# Altium footprint library 集大电协1.2.PcbLib: 197 footprints (part 5 of 13)
Each footprint in its own frame and in the unit in brackets; x right, y up, seen from the top. Pads: shape width x height; smd on the part's side, far side on the other; paste and mask are expansions set on the pad; w line width, h text height; cw(c..) or ccw(c..) is an arc to the next point about the centre after c.
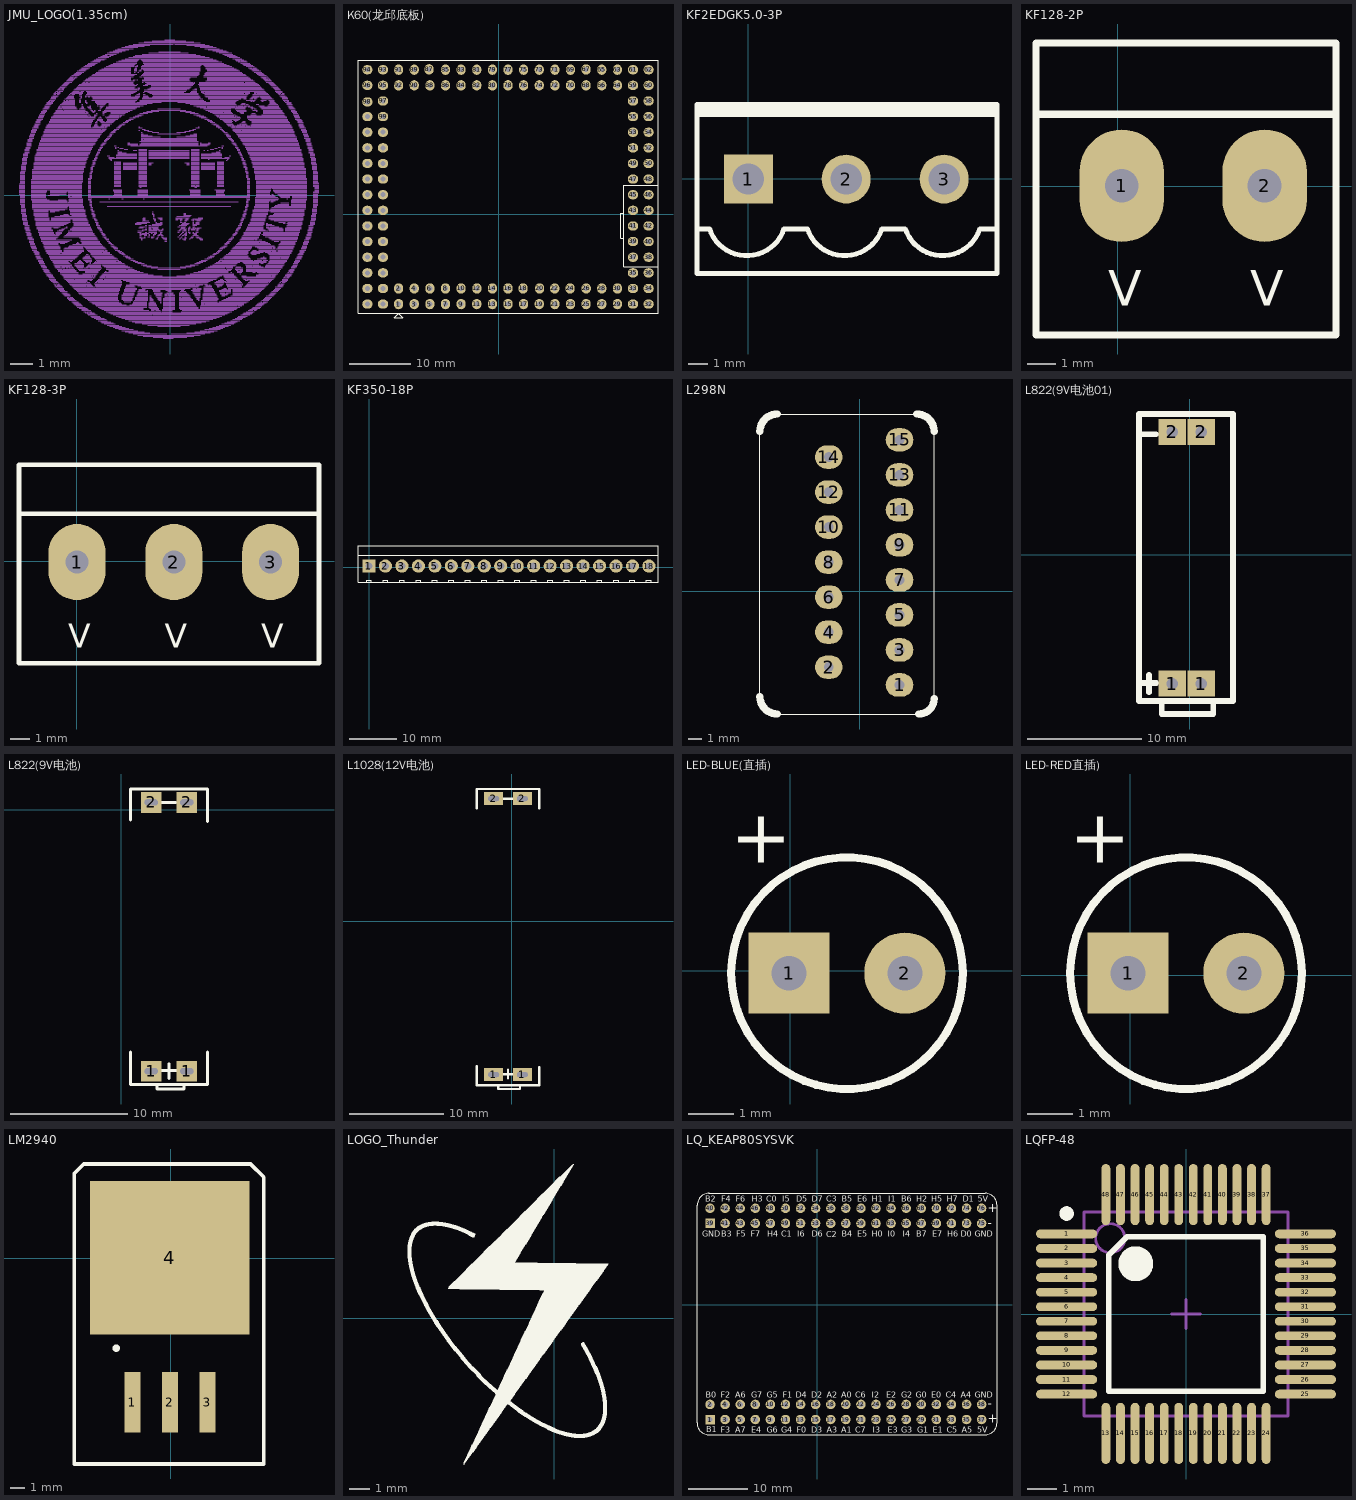
[diagram p4: the footprints below, top view; thin cyan lines are the x and y axes]

## JMU_LOGO(1.35cm) [mm]
Bottom Overlay:
  drawing of 2455 lines, arcs and shapes, not listed
  text "1918" at -0.759,-2.891 h1.27

## K60(龙邱底板) [mil]
pads (124):
  oval 59x66 hole 32: 1(-640,-575.68) 2(-640,-475.68) 3(-540,-575.68) 4(-540,-475.68) 5(-440,-575.68) 6(-440,-475.68) 7(-340,-575.68) 8(-340,-475.68) 9(-240,-575.68) 10(-240,-475.68) 11(-140,-575.68) 12(-139.21,-475.68) 13(-40,-575.68) 14(-40,-475.68) 15(60,-575.68) 16(60,-475.68) 17(160,-575.68) 18(156.85,-475.68) 19(260,-575.68) 20(262.36,-475.68) 21(360,-575.68) 22(358.82,-475.68) 23(460,-575.68) 24(457.64,-475.68) 25(560,-575.68) 26(560.39,-475.68) 27(660,-575.68) 28(660,-475.68) 29(760,-575.68) 30(760.39,-475.68) 63(760,924.32) 64(760,824.32) 65(660,924.32) 66(660,824.32) 67(560,926.29) 68(560,824.32) 69(460,924.32) 70(460,824.32) 71(360,924.32) 72(360,824.32) 73(260,924.32) 74(260,824.32) 75(160,924.32) 76(160,824.32) 77(60,924.32) 78(60,824.32) 79(-40,924.32) 80(-40,824.32) 81(-140,924.32) 82(-140,824.32) 83(-240,924.32) 84(-240,824.32) 85(-340,924.32) 86(-340,824.32) 87(-445.12,926.68) 88(-440,824.32) 89(-540,924.32) 90(-540,824.32) 91(-640,924.32) 92(-640,824.32)
  oval 66x59 hole 32: 31(860,-575.68) 32(960,-575.68) 33(860,-475.68) 34(960,-475.68) 35(860,-375.68) 36(960,-375.68) 37(860,-275.68) 38(960,-275.68) 39(860,-174.89) 40(960,-175.68) 41(860,-75.68) 42(960,-75.29) 43(860,24.32) 44(960,24.32) 45(860,124.32) 46(960,124.32) 47(860,224.32) 48(960,224.32) 49(860,324.32) 50(960,324.32) 51(860,424.32) 52(960,424.32) 53(860,524.32) 54(960,524.32) 55(860,624.32) 56(960,624.32) 57(860,724.32) 58(960,724.32) 59(860,824.32) 60(960,824.32) 61(860,924.32) 62(960,924.32) 93(-740,924.32) 94(-840,924.32) 95(-740,824.32) 96(-840,824.32) 97(-740,724.32) 98(-840,718.41) 99(-740,624.32) 100(-840,624.32) 101(-740,524.32) 102(-840,524.32) 103(-740,424.32) 104(-840,424.32) 105(-740,323.92) 106(-840,324.71) 107(-740,224.32) 108(-840,224.32) 109(-740,124.32) 110(-840,124.32) 111(-740,24.32) 112(-840,24.32) 113(-740,-75.68) 114(-840,-75.68) 115(-740,-175.68) 116(-840,-175.68) 117(-740,-275.68) 118(-840,-275.68) 119(-740,-375.68) 120(-840,-375.68) 121(-740,-475.68) 122(-840,-475.68) 123(-740,-575.68) 124(-840,-575.68)
Top Overlay:
  lines w5.91: 800,-155.68 780,-155.68 780,4.32 800,4.32 ; 1020,-335.68 800,-335.68 800,184.32 1020,184.32
  lines w7.87: -641.18,-634.74 -614.02,-662.3 -668.35,-662.3 -640.79,-634.74 ; -900,-635.68 1020,-635.68 1020,984.32 -900,984.32 -900,-635.68

## KF2EDGK5.0-3P [mm]
pads (3):
  rect 2.5x2.5 hole 1.6: 1(0,-0.025)
  round 2.5 hole 1.6: 2(5,-0.025) 3(10,-0.025)
Top Overlay:
  lines w0.254: -2.62,-2.565 -1.985,-2.565 ccw(c-0.08,-1.93) 1.825,-2.565 3.015,-2.565 ccw(c4.92,-1.93) 6.825,-2.565 8.015,-2.565 ccw(c9.92,-1.93) 11.825,-2.565 12.667,-2.565 ; -2.62,3.277 12.7,3.277 ; -2.62,3.531 12.7,3.531 ; -2.62,-4.851 -2.62,3.785 12.7,3.785 12.7,-4.851 -2.62,-4.851
3D body "KF2EDGK5.0-LI.STEP": height 11.25, standoff -2.95, extent 2.46,-4.783 7.54,3.717
3D body "KF2EDGK5.0-LI.STEP": height 11.25, standoff -2.95, extent -2.54,-4.783 2.54,3.717
3D body "KF2EDGK5.0-LI.STEP": height 11.25, standoff -2.95, extent 7.46,-4.783 12.54,3.717

## KF128-2P [mm]
pads (2):
  oval 3x4 hole 1.2: 1(0.134,0.024) 2(5.214,0.024)
Top Overlay:
  lines w0.254: -2.914,2.564 7.754,2.564 ; -2.914,-5.285 7.754,-5.285 7.754,5.1 -2.914,5.1 -2.914,-5.285
  text "V" at -0.347,-4.245 h1.27
  text "V" at 4.706,-4.245 h1.27
3D body "KF128-5.08-.STEP": height 14.15, standoff -3.95, extent 2.166,-5.353 7.746,5.147
3D body "KF128-5.08-.STEP": height 14.15, standoff -3.95, extent -2.914,-5.353 2.666,5.147

## KF128-3P [mm]
pads (3):
  oval 3x4 hole 1.2: 1(0.025,-0.05) 2(5.105,-0.05) 3(10.185,-0.05)
Top Overlay:
  lines w0.254: -3.023,2.49 12.725,2.49 ; -3.023,-5.359 12.725,-5.359 12.725,5.055 -3.023,5.055 -3.023,-5.359
  text "V" at 9.681,-4.545 h1.27
  text "V" at 4.628,-4.545 h1.27
  text "V" at -0.425,-4.545 h1.27
3D body "KF128-5.08-.STEP": height 14.15, standoff -3.95, extent 7.144,-5.434 12.724,5.066
3D body "KF128-5.08-.STEP": height 14.15, standoff -3.95, extent 2.064,-5.434 7.644,5.066
3D body "KF128-5.08-.STEP": height 14.15, standoff -3.95, extent -3.016,-5.434 2.564,5.066

## KF350-18P [mil]
pads (18):
  rect 110x110 hole 59.06: 1(-1.14,8.5)
  round 110 hole 59.06: 2(136.65,8.5) 3(274.45,8.51) 4(412.25,8.51) 5(550.04,8.51) 6(687.84,8.51) 7(825.63,8.5) 8(963.43,8.5) 9(1101.22,8.5) 10(1239.02,8.5) 11(1376.81,8.5) 12(1514.61,8.5) 13(1652.4,8.5) 14(1790.2,8.5) 15(1927.99,8.5) 16(2065.99,8.5) 17(2203.74,8.5) 18(2341.54,8.5)
Top Overlay:
  lines w10: -93.14,100.5 1039.86,100.5 1176.14,100.5 ; -21.14,-128.5 -21.14,-111.5 18.86,-111.5 18.86,-128.5 ; 116.65,-128.5 116.65,-111.5 156.65,-111.5 156.65,-128.5 ; 254.45,-128.49 254.45,-111.5 294.45,-111.5 294.45,-128.49 ; 392.25,-128.49 392.25,-111.5 432.25,-111.5 432.25,-128.49 ; 530.04,-128.49 530.04,-111.5 570.04,-111.5 570.04,-128.49 ; 667.86,-128.5 667.86,-111.5 707.86,-111.5 707.86,-128.5 ; 805.86,-128.5 805.86,-111.5 845.86,-111.5 845.86,-128.5 ; 943.86,-128.5 943.86,-111.5 983.86,-111.5 983.86,-128.5 ; 1081.65,-128.5 1081.65,-111.5 1121.65,-111.5 1121.65,-128.5 ; 1177.65,100.5 1313.94,100.5 ; 1219.45,-128.5 1219.45,-111.5 1259.45,-111.5 1259.45,-128.5 ; 1315.45,100.5 1451.73,100.5 ; 1357.25,-128.5 1357.25,-111.5 1397.25,-111.5 1397.25,-128.5 ; 1453.25,100.5 1589.53,100.5 ; 1495.04,-128.5 1495.04,-111.5 1535.04,-111.5 1535.04,-128.5 ; 1591.04,100.5 1727.32,100.5 ; 1632.84,-128.5 1632.84,-111.5 1672.84,-111.5 1672.84,-128.5 ; 1728.84,100.5 1865.12,100.5 ; 1770.63,-128.5 1770.63,-111.5 1810.63,-111.5 1810.63,-128.5 ; 1866.63,100.5 2002.91,100.5 ; 1908.43,-128.5 1908.43,-111.5 1948.43,-111.5 1948.43,-128.5 ; 1996.63,100.5 2416.34,100.39 ; 2046.43,-128.5 2046.43,-111.5 ; 2047.43,-111.5 2087.43,-111.5 2087.43,-128.5 ; 2181.27,-126.53 2181.27,-109.53 ; 2182.27,-109.53 2222.27,-109.53 2222.27,-126.53 ; 2319.06,-127.51 2319.06,-110.51 ; 2320.06,-110.51 2360.06,-110.51 2360.06,-127.51 ; -93.14,-128.5 -93.14,180.5 1039.86,180.5 1177.65,180.5 1315.45,180.5 1453.25,180.5 1591.04,180.5 1728.84,180.5 1866.63,180.5 2417.32,180.5 2417.32,-128.5 1866.63,-128.5 1728.84,-128.5 1591.04,-128.5 1453.25,-128.5 1315.45,-128.5 1177.65,-128.5 1039.86,-128.5 -93.14,-128.5

## L298N [mm]
pads (15):
  oval 2x1.7 hole 0.712: 1(2.87,-6.807) 2(-2.261,-5.512) 3(2.87,-4.267) 4(-2.261,-2.972) 5(2.87,-1.727) 6(-2.261,-0.432) 7(2.87,0.813) 8(-2.261,2.108) 9(2.87,3.353) 10(-2.261,4.648) 11(2.87,5.893) 12(-2.261,7.188) 13(2.87,8.433) 14(-2.261,9.728) 15(2.87,10.973)
Top Overlay:
  lines w0.076: -7.264,-7.645 -7.264,11.582 ; -5.994,-8.915 4.267,-8.915 ; -5.994,12.852 4.115,12.852 ; 5.385,-7.925 5.385,11.582
  lines w0.54: -7.264,-7.645 ccw(c-5.994,-7.645) -5.994,-8.915 ; -7.264,11.582 cw(c-5.994,11.582) -5.994,12.852 ; 4.115,12.852 cw(c4.115,11.582) 5.385,11.582 ; 4.267,-8.915 ccw(c4.267,-7.798) 5.385,-7.798
3D body "User Library-Multiwatt15V.STEP": height 21.3, standoff -1, extent -6.883,-7.666 3.007,11.934

## L822(9V电池01) [mil]
pads (4):
  rect 95x90 hole 40: 1(-60,-445) 1(40,-445) 2(-60,423) 2(40,423)
Top Overlay:
  lines w20: -165,-442.72 -115,-442.72 ; -165,415 -115.94,415 ; -140.63,-475 -140.63,-415 ; -95.94,-510.51 -95.94,-549.88 81.22,-549.88 81.22,-510.51 ; -175,-505 -175,-145.55 -175,485 150,485 150,-505 -175,-505

## L822(9V电池) [mil]
pads (4):
  rect 70x70 hole 20 slot 45 at 0 deg: 1(100,-880) 1(220,-880) 2(100,25) 2(220,25)
Top Overlay:
  lines w10: 30,-815 30,-925 290,-925 290,-815 ; 30,-35 30,70 290,70 290,-40 ; 120,-930 120,-940 210,-940 210,-930 ; 135,25 184.06,25 ; 135.63,-877.72 185.63,-877.72 ; 160,-905 160,-855

## L1028(12V电池) [mil]
pads (4):
  rect 80x55 hole 20 slot 45 at 0 deg: 1(-75,-640) 1(45,-640) 2(-75,510) 2(45,510)
Top Overlay:
  lines w10: -145,-605 -145,-685 115,-685 115,-610 ; -145,470 -145,550 115,550 115,470 ; -55,-690 -55,-700 35,-700 35,-690 ; -40,510 9.06,510 ; -39.37,-637.72 10.63,-637.72 ; -15,-655 -15,-620

## LED-BLUE(直插) [mil]
pads (2):
  rect 70x70 hole 30: 1(-0.98,-1.97)
  round 70 hole 30: 2(99.02,-1.97)
Top Overlay:
  circle w7: c49.02,-1.97 r100
  text "+" at 1.39,78.32 h78.74
3D body: height 204.72, standoff -78.74, extent -21.65,-79.72 116.93,77.76

## LED-RED直插) [mil]
pads (2):
  rect 70x70 hole 30: 1(-1.97,1.97)
  round 70 hole 30: 2(98.03,1.97)
Top Overlay:
  circle w7: c48.03,1.97 r100
  text "+" at 0.41,82.26 h78.74
3D body: height 204.72, standoff -78.74, extent -19.68,-76.76 118.9,80.71

## LM2940 [mm]
pads (4):
  rect 1.1x4.1 smd: 1(-2.591,-9.732) 2(-0.051,-9.732) 3(2.489,-9.732)
  rect 10.8x10.41 smd: 4(-0.051,0.047)
Top Overlay:
  circle w0.25: c-3.691,-6.076 r0.125
  lines w0.254: -6.528,-13.923 -6.528,5.762 -5.893,6.397 5.41,6.397 6.299,5.508 6.299,-13.923 -6.528,-13.923
3D body: height 5, standoff 0, extent -6.2,-5.2 6,6.2

## LOGO_Thunder [mm]
Top Overlay:
  drawing of 2284 lines, arcs and shapes, not listed

## LQ_KEAP80SYSVK [mm]
pads (76):
  rect 1.6x1.6 hole 0.9: 1(-18.016,-19.342) 39(-18.016,13.678)
  round 1.6 hole 0.9: 2(-18.016,-16.802) 3(-15.476,-19.342) 4(-15.476,-16.802) 5(-12.936,-19.342) 6(-12.936,-16.802) 7(-10.396,-19.342) 8(-10.396,-16.802) 9(-7.856,-19.342) 10(-7.856,-16.802) 11(-5.316,-19.342) 12(-5.316,-16.802) 13(-2.776,-19.342) 14(-2.776,-16.802) 15(-0.236,-19.342) 16(-0.236,-16.802) 17(2.304,-19.342) 18(2.304,-16.802) 19(4.844,-19.342) 20(4.844,-16.802) 21(7.384,-19.342) 22(7.384,-16.802) 23(9.924,-19.342) 24(9.924,-16.802) 25(12.464,-19.342) 26(12.464,-16.802) 27(15.004,-19.342) 28(15.004,-16.802) 29(17.544,-19.342) 30(17.544,-16.802) 31(20.084,-19.342) 32(20.084,-16.802) 33(22.624,-19.342) 34(22.624,-16.802) 35(25.164,-19.342) 36(25.164,-16.802) 37(27.704,-19.342) 38(27.704,-16.802) 40(-18.016,16.218) 41(-15.476,13.678) 42(-15.476,16.218) 43(-12.936,13.678) 44(-12.936,16.218) 45(-10.396,13.678) 46(-10.396,16.218) 47(-7.856,13.678) 48(-7.856,16.218) 49(-5.316,13.678) 50(-5.316,16.218) 51(-2.776,13.678) 52(-2.776,16.218) 53(-0.236,13.678) 54(-0.236,16.218) 55(2.304,13.678) 56(2.304,16.218) 57(4.844,13.678) 58(4.844,16.218) 59(7.384,13.678) 60(7.384,16.218) 61(9.924,13.678) 62(9.924,16.218) 63(12.464,13.678) 64(12.464,16.218) 65(15.004,13.678) 66(15.004,16.218) 67(17.544,13.678) 68(17.544,16.218) 69(20.084,13.678) 70(20.084,16.218) 71(22.624,13.678) 72(22.624,16.218) 73(25.164,13.678) 74(25.164,16.218) 75(27.704,13.678) 76(27.704,16.218)
Top Overlay:
  lines w0.2: -20.208,16.739 -20.208,-19.905 ccw(c-18.208,-19.905) -18.208,-21.905 28.292,-21.905 ccw(c28.292,-19.905) 30.292,-19.905 30.292,16.739 ccw(c28.292,16.739) 28.292,18.739 -18.208,18.739 ; -20.158,16.749 cw(c-18.158,16.749) -18.158,18.749
  text "-" at 28.752,13.039 h1.5
  text "+" at 28.742,-19.901 h1.5
  text "-" at 28.752,-17.401 h1.5
  text "+" at 28.762,15.579 h1.5
  text "C3" at 1.522,17.289 h1
  text "H2" at 16.702,17.289 h1
  text "5V" at 26.992,-21.561 h1
  text "A5" at 24.322,-21.561 h1
  text "C5" at 21.822,-21.561 h1
  text "E1" at 19.482,-21.551 h1
  text "G1" at 16.902,-21.561 h1
  text "G3" at 14.132,-21.561 h1
  text "E3" at 11.882,-21.551 h1
  text "I3" at 9.352,-21.561 h1
  text "C7" at 6.472,-21.561 h1
  text "A1" at 4.082,-21.561 h1
  text "A3" at 1.602,-21.561 h1
  text "D3" at -0.938,-21.561 h1
  text "F0" at -3.428,-21.561 h1
  text "G4" at -6.068,-21.561 h1
  text "G6" at -8.488,-21.561 h1
  text "E4" at -11.048,-21.561 h1
  text "A7" at -13.768,-21.561 h1
  text "F3" at -16.208,-21.561 h1
  text "GND" at 26.532,-15.641 h1
  text "A4" at 24.212,-15.641 h1
  text "C4" at 21.652,-15.641 h1
  text "E0" at 19.192,-15.641 h1
  text "G0" at 16.642,-15.641 h1
  text "G2" at 14.132,-15.641 h1
  text "E2" at 11.642,-15.641 h1
  text "I2" at 9.212,-15.641 h1
  text "C6" at 6.472,-15.641 h1
  text "A0" at 4.082,-15.641 h1
  text "A2" at 1.602,-15.641 h1
  text "D2" at -0.938,-15.641 h1
  text "D4" at -3.548,-15.641 h1
  text "F1" at -5.798,-15.641 h1
  text "G5" at -8.488,-15.641 h1
  text "G7" at -11.048,-15.641 h1
  text "A6" at -13.768,-15.641 h1
  text "F2" at -16.208,-15.641 h1
  text "B0" at -18.758,-15.641 h1
  text "GND" at 26.512,11.399 h1
  text "D0" at 24.192,11.399 h1
  text "H6" at 21.952,11.399 h1
  text "E7" at 19.392,11.389 h1
  text "B7" at 16.722,11.399 h1
  text "I4" at 14.442,11.389 h1
  text "I0" at 11.872,11.389 h1
  text "H0" at 9.222,11.399 h1
  text "E5" at 6.772,11.389 h1
  text "B4" at 4.162,11.399 h1
  text "C2" at 1.552,11.379 h1
  text "D6" at -0.858,11.399 h1
  text "I6" at -3.308,11.429 h1
  text "C1" at -5.988,11.399 h1
  text "H4" at -8.408,11.399 h1
  text "F7" at -11.138,11.389 h1
  text "F5" at -13.568,11.389 h1
  text "B3" at -16.128,11.399 h1
  text "GND" at -19.328,11.429 h1
  text "5V" at 27.052,17.289 h1
  text "D1" at 24.532,17.289 h1
  text "H7" at 21.872,17.289 h1
  text "H5" at 19.252,17.289 h1
  text "B6" at 14.192,17.289 h1
  text "I1" at 11.962,17.289 h1
  text "H1" at 9.232,17.289 h1
  text "E6" at 6.772,17.289 h1
  text "B5" at 4.142,17.289 h1
  text "D7" at -0.878,17.289 h1
  text "D5" at -3.488,17.289 h1
  text "I5" at -5.878,17.319 h1
  text "C0" at -8.568,17.289 h1
  text "H3" at -10.988,17.289 h1
  text "F6" at -13.708,17.289 h1
  text "F4" at -16.148,17.289 h1
  text "B2" at -18.788,17.289 h1
  text "B1" at -18.618,-21.521 h1

## LQFP-48 [mm]
pads (48):
  oval 2.1x0.3 smd: 1(-4.1,2.75) 2(-4.1,2.25) 3(-4.1,1.75) 4(-4.1,1.25) 5(-4.1,0.75) 6(-4.1,0.25) 7(-4.1,-0.25) 8(-4.1,-0.75) 9(-4.1,-1.25) 10(-4.1,-1.75) 11(-4.1,-2.25) 12(-4.1,-2.75) 25(4.1,-2.75) 26(4.1,-2.25) 27(4.1,-1.75) 28(4.1,-1.25) 29(4.1,-0.75) 30(4.1,-0.25) 31(4.1,0.25) 32(4.1,0.75) 33(4.1,1.25) 34(4.1,1.75) 35(4.1,2.25) 36(4.1,2.75)
  oval 0.3x2.1 smd: 13(-2.75,-4.1) 14(-2.25,-4.1) 15(-1.75,-4.1) 16(-1.25,-4.1) 17(-0.75,-4.1) 18(-0.25,-4.1) 19(0.25,-4.1) 20(0.75,-4.1) 21(1.25,-4.1) 22(1.75,-4.1) 23(2.25,-4.1) 24(2.75,-4.1) 37(2.75,4.1) 38(2.25,4.1) 39(1.75,4.1) 40(1.25,4.1) 41(0.75,4.1) 42(0.25,4.1) 43(-0.25,4.1) 44(-0.75,4.1) 45(-1.25,4.1) 46(-1.75,4.1) 47(-2.25,4.1) 48(-2.75,4.1)
Top Overlay:
  circle w0.6: c-1.725,1.725 r0.3
  circle w0.25: c-4.1,3.45 r0.125
  lines w0.2: -2.65,-2.65 -2.65,2.025 -2.025,2.65 2.65,2.65 2.65,-2.65 -2.65,-2.65
Mechanical 13:
  circle w0.1: c-2.6,2.6 r0.5
  lines w0.1: -3.5,-3.5 3.5,-3.5 3.5,3.5 -3.5,3.5 -3.5,-3.5
Mechanical 15:
  lines w0.1: -0.5,0 0.5,0 ; 0,-0.5 0,0.5
3D body: height 1.5, standoff 0, extent -4.5,-4.5 4.5,4.5